# Altium footprint library PcbLib1.PcbLib: 1016 footprints (part 39 of 64)
Each footprint in its own frame and in the unit in brackets; x right, y up, seen from the top. Pads: shape width x height; smd on the part's side, far side on the other; paste and mask are expansions set on the pad; w line width, h text height; cw(c..) or ccw(c..) is an arc to the next point about the centre after c.
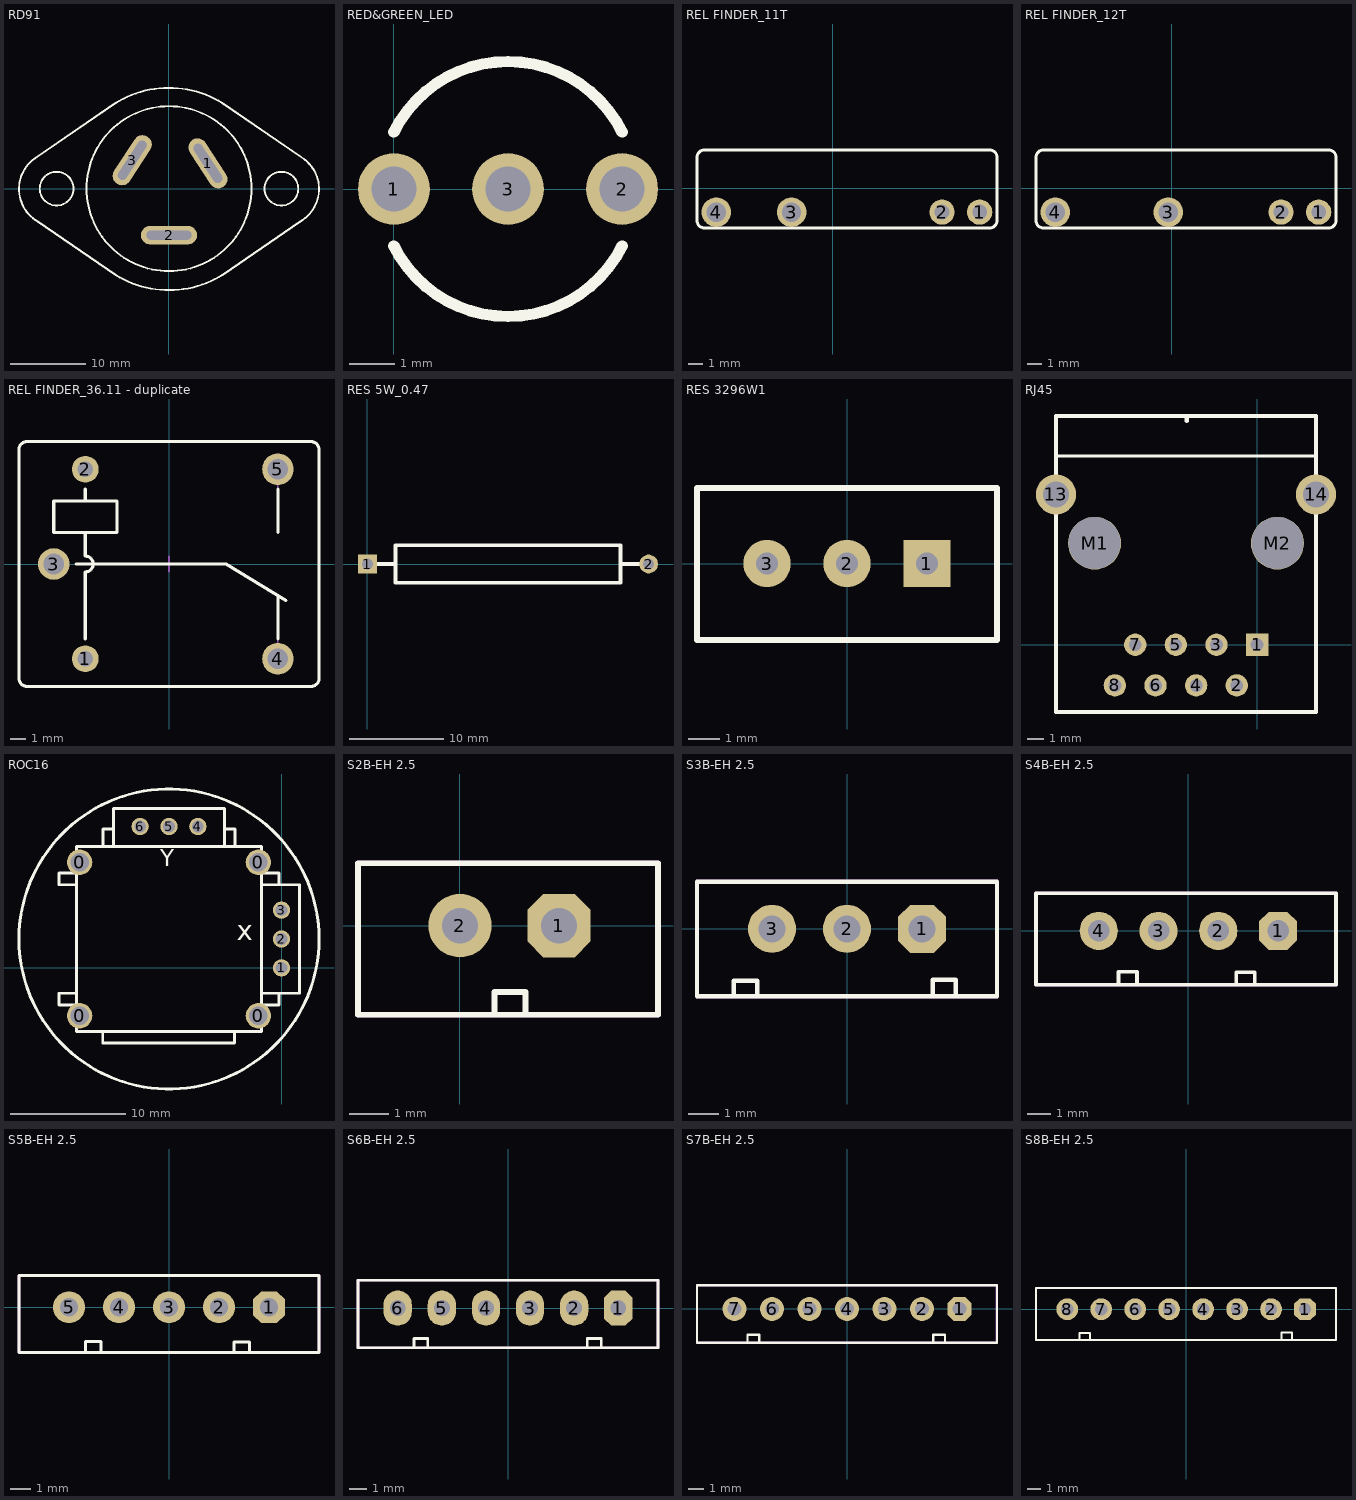
[diagram p38: the footprints below, top view; thin cyan lines are the x and y axes]

## RD91 [mm]
pads (3):
  oval 7.5x2.5 hole 1.2 slot 6 at 123 deg rot 123: 1(5.2,3.38)
  oval 7.5x2.5 hole 1.2 slot 6 at 0 deg: 2(0,-6.2)
  oval 7.5x2.5 hole 1.2 slot 6 at 57 deg rot 57: 3(-4.9,3.8)
Top Overlay:
  circle w0.254: c15,0 r2.25
  circle w0.254: c-15,0 r2.25
  circle w0.254: c0,0 r11
  lines w0.254: -17.599,4.245 ccw(c-15,-0.043) -17.502,-4.389 -7.123,-11.514 ccw(c0,-0.043) 7.234,-11.444 17.522,-4.378 ccw(c15,-0.043) 17.56,4.268 7.123,11.427 ccw(c0,-0.043) -7.234,11.357 -17.599,4.245

## RED&GREEN_LED [mm]
pads (3):
  round 1.6 hole 1 mask+0.051: 1(0,0) 2(5.08,0) 3(2.54,0)
Top Overlay:
  lines w0.254: 0,-1.27 ccw(c2.54,0) 5.08,-1.27 ; 0,1.27 cw(c2.54,0) 5.08,1.27

## REL FINDER_11T [mm] "8 Leads, Row Spacing 12 mm; Body 19mm x 15.5mm, 36 Serie"
height 15.5
pads (4):
  round 1.7 hole 1: 1(9.931,-1.626) 2(7.392,-1.626)
  round 2 hole 1.3: 3(-2.769,-1.626) 4(-7.849,-1.626)
Top Overlay:
  lines w0.2: -9.153,2.068 cw(c-8.653,2.068) -8.653,2.568 10.631,2.568 cw(c10.631,2.1) 11.1,2.1 11.1,-2.195 cw(c10.6,-2.195) 10.6,-2.695 -8.653,-2.695 cw(c-8.653,-2.195) -9.153,-2.195 -9.153,2.134
Mechanical 14:
  lines w0.1: 10.566,2.568 -8.645,2.568 ccw(c-8.645,2.068) -9.145,2.068 -9.145,-2.195 ccw(c-8.645,-2.195) -8.645,-2.695 10.6,-2.695 ccw(c10.6,-2.195) 11.1,-2.195 11.1,2.068 ccw(c10.6,2.068) 10.6,2.568

## REL FINDER_12T [mm] "8 Leads, Row Spacing 12 mm; Body 19mm x 15.5mm, 36 Serie"
height 15.5
pads (4):
  round 1.7 hole 1: 1(9.931,-1.626) 2(7.392,-1.626)
  round 2 hole 1.3: 3(-0.226,-1.626) 4(-7.849,-1.626)
Top Overlay:
  lines w0.2: -9.153,2.068 cw(c-8.653,2.068) -8.653,2.568 10.631,2.568 cw(c10.631,2.1) 11.1,2.1 11.1,-2.195 cw(c10.6,-2.195) 10.6,-2.695 -8.653,-2.695 cw(c-8.653,-2.195) -9.153,-2.195 -9.153,2.134
Mechanical 14:
  lines w0.1: 10.566,2.568 -8.645,2.568 ccw(c-8.645,2.068) -9.145,2.068 -9.145,-2.195 ccw(c-8.645,-2.195) -8.645,-2.695 10.6,-2.695 ccw(c10.6,-2.195) 11.1,-2.195 11.1,2.068 ccw(c10.6,2.068) 10.6,2.568
3D body "20737.stp": height 17.7, standoff -3.3, extent -9.195,-2.616 11.105,2.464

## REL FINDER_36.11 - duplicate [mm] "8 Leads, Row Spacing 12 mm; Body 19mm x 15.5mm, 36 Serie"
height 15.5
pads (5):
  round 1.7 hole 1: 1(-5.3,-6) 2(-5.3,6)
  round 2 hole 1.3: 3(-7.3,0) 4(6.9,-6) 5(6.9,6)
Top Overlay:
  lines w0.2: -5.9,0 3.6,0 7.4,-2.303 ; -5.3,-4.75 -5.3,-0.5 ccw(c-5.3,0) -5.3,0.5 -5.3,2 ; -5.3,4 -5.3,4.75 ; 6.9,-4.75 6.9,-2 ; 6.9,2 6.9,4.75 ; -9.5,-7.25 ccw(c-9,-7.25) -9,-7.75 9,-7.75 ccw(c9,-7.25) 9.5,-7.25 9.5,7.25 ccw(c9,7.25) 9,7.75 -9,7.75 ccw(c-9,7.25) -9.5,7.25 -9.5,-7.25 ; -7.3,2 -7.3,4 -3.3,4 -3.3,2 -7.3,2
Mechanical 8:
  lines w0.1: -7.8,0 -7.3,0 ; -7.3,-0.5 -7.3,0 ; -7.3,0.5 -7.3,0 ; -6.8,0 -7.3,0 ; -5.8,-6 -5.3,-6 ; -5.8,6 -5.3,6 ; -5.3,-6.5 -5.3,-6 ; -5.3,-5.5 -5.3,-6 ; -5.3,5.5 -5.3,6 ; -5.3,6.5 -5.3,6 ; -4.8,-6 -5.3,-6 ; -4.8,6 -5.3,6 ; -0.5,0 0,0 ; 0,-0.5 0,0 ; 0,0.5 0,0 ; 0.5,0 0,0 ; 6.4,-6 6.9,-6 ; 6.4,6 6.9,6 ; 6.9,-6.5 6.9,-6 ; 6.9,-5.5 6.9,-6 ; 6.9,5.5 6.9,6 ; 6.9,6.5 6.9,6 ; 7.4,-6 6.9,-6 ; 7.4,6 6.9,6
Mechanical 14:
  lines w0.1: -5.9,0 3.6,0 7.4,-2.303 ; -5.3,-4.75 -5.3,-0.5 ccw(c-5.3,0) -5.3,0.5 -5.3,2 ; -5.3,4 -5.3,4.75 ; 6.9,-6 6.9,-2 ; 6.9,2 6.9,6 ; -9.5,-7.25 ccw(c-9,-7.25) -9,-7.75 9,-7.75 ccw(c9,-7.25) 9.5,-7.25 9.5,7.25 ccw(c9,7.25) 9,7.75 -9,7.75 ccw(c-9,7.25) -9.5,7.25 -9.5,-7.25 ; -7.3,2 -7.3,4 -3.3,4 -3.3,2 -7.3,2
3D body "REL_FINDER_36.11.stp": height 15.5, standoff -3.6, extent -9.5,-7.75 9.5,7.75

## RES 5W_0.47 [mm]
pads (2):
  rect 2x2 hole 1.2 mask+0.051: 1(0,0)
  round 2 hole 1.2 mask+0.051: 2(30,0)
Top Overlay:
  lines w0.381: 1,0 3,0 ; 27,0 29,0 ; 3,0 3,-2 27,-2 27,2 3,2 3,0

## RES 3296W1 [mm] "Bourns,3296Y,25,±10% ,1/2W,±100ppm/°C"
pads (3):
  rect 1.5x1.5 hole 0.7: 1(2.54,0)
  round 1.5 hole 0.7 mask+0.07: 2(0,0) 3(-2.54,0)
Top Overlay:
  lines w0.2: -4.765,-2.431 4.765,-2.431 4.765,2.399 -4.765,2.399 -4.765,-2.431
3D body "0_7-0_7.stp": height 0, standoff -2.2, extent 1.94,-0.616 3.14,0.584
3D body "0_7-0_7.stp": height 0, standoff -2.2, extent -3.14,-0.616 -1.94,0.584
3D body "0_7-0_7.stp": height 0, standoff -2.2, extent -0.6,-0.616 0.6,0.584
3D body "vr6.stp": height 11.05, standoff -3, extent -4.775,-2.441 4.775,2.459

## RJ45 [mil] "RJ45无灯网口"
pads (12):
  rect 55x55 hole 31.5: 1(0,0)
  round 55 hole 31.5: 2(-50,-100) 3(-100,0) 4(-150,-100) 5(-200,0) 6(-250,-100) 7(-300,0) 8(-350,-100)
  round 98.42 hole 62.99: 13(-495,370) 14(145,370)
  round 130 hole 127.95 unplated: M1(-400,250) M2(50,250)
Top Overlay:
  lines w8: -488.19,464.57 141.73,464.57
  lines w10: -495,-165.35 144.65,-165.35 145,-165 145,370 145,562.99 -495,562.99 -495,370 -495,-165 ; -173.23,551.18 -173.23,559.06
3D body "Mod-Jack-K122449007-Stig-W.STEP": height 127.85, standoff -555.12, extent -490,-172.17 139.92,556.17

## ROC16 [mm]
pads (10):
  round 2.2 hole 1.6: 0(-17.5,-4.15) 0(-17.5,9.15) 0(-2,-4.15) 0(-2,9.15)
  round 1.5 hole 1: 1(0,0) 2(0,2.5) 3(0,5) 4(-7.25,12.25) 5(-9.75,12.25) 6(-12.25,12.25)
Top Overlay:
  circle w0.254: c-9.75,2.5 r13
  lines w0.254: -17.75,-3.215 -19.275,-3.215 -19.275,-2.199 -17.75,-2.199 ; -17.75,7.199 -19.275,7.199 -19.275,8.215 -17.75,8.215 ; -15.491,-5.528 -15.491,-6.517 -4.061,-6.517 -4.061,-5.527 -4.087,-5.553 ; -15.465,10.5 -15.465,12.025 -14.55,12.025 ; -14.55,10.5 -14.55,13.8 -4.95,13.8 -4.95,10.5 ; -4.95,11.644 -4.95,10.5 ; -4.95,12.025 -4.035,12.025 -4.035,10.5 ; -4.924,10.526 -4.95,10.5 ; -1.75,-3.215 -0.225,-3.215 -0.225,-2.199 ; -1.75,-2.199 -0.225,-2.199 ; -1.75,7.199 -0.225,7.199 ; -1.75,8.215 -0.225,8.215 -0.225,7.199 ; -0.225,-2.199 1.55,-2.199 1.551,0.075 ; -0.225,7.199 1.553,7.199 1.552,4.824 1.551,0.075 ; 1.551,0.075 1.551,0.075 ; -17.75,-5.5 -17.75,10.5 -1.75,10.5 -1.75,-5.5 -17.75,-5.5
  text "Y" at -10.512,8.342 h2.5
  text "x" at -3.883,1.763 h3
3D body "ROC16-.STEP": height 29.36, standoff -3.65, extent -22.25,-10.054 2.75,14.946

## S2B-EH 2.5 [mm]
height 3.25
pads (2):
  oct 1.6x1.6 hole 0.9: 1(2.5,0)
  round 1.6 hole 0.9 mask+0.07: 2(0,0)
Top Overlay:
  lines w0.15: 0.875,-2.175 0.875,-1.675 1.65,-1.675 1.65,-2.2 ; -2.575,-2.25 5,-2.25 5,1.575 -2.575,1.575 -2.575,-2.25
Mechanical 14:
  lines w0.15: -2.575,-2.25 5,-2.25 5,1.575 -2.575,1.575 -2.575,-2.25
Mechanical 15:
  lines w0.15: -2.575,-2.25 5,-2.25 5,1.575 -2.575,1.575 -2.575,-2.25
3D body "s2b-eh.stp": height 6, standoff -3.2, extent -2.575,-2.175 4.925,1.625

## S3B-EH 2.5 [mm]
height 3.25
pads (3):
  oct 1.6x1.6 hole 0.9: 1(2.5,0)
  round 1.6 hole 0.9 mask+0.07: 2(0,0) 3(-2.5,0)
Top Overlay:
  lines w0.15: -3.775,-2.225 -3.775,-1.725 -3,-1.725 -3,-2.25 ; 2.85,-2.2 2.85,-1.7 3.625,-1.7 3.625,-2.225 ; -5,-2.25 5,-2.25 5,1.575 -5,1.575 -5,-2.25
Mechanical 14:
  lines w0.15: -5,-2.25 5,-2.25 5,1.575 -5,1.575 -5,-2.25
Mechanical 15:
  lines w0.15: -5,-2.25 5,-2.25 5,1.575 -5,1.575 -5,-2.25
3D body "s3b-eh.stp": height 6, standoff -3.2, extent -5,-2.225 5,1.575

## S4B-EH 2.5 [mm]
height 3.25
pads (4):
  oct 1.6x1.6 hole 0.9: 1(3.75,0)
  round 1.6 hole 0.9 mask+0.07: 2(1.25,0) 3(-1.25,0) 4(-3.75,0)
Top Overlay:
  lines w0.15: -2.925,-2.2 -2.925,-1.7 -2.15,-1.7 -2.15,-2.225 ; 2,-2.225 2,-1.725 2.775,-1.725 2.775,-2.25 ; -6.375,-2.25 -6.375,1.575 6.175,1.575 6.175,-2.25 -6.375,-2.25
Mechanical 14:
  lines w0.15: -6.375,-2.25 -6.375,1.575 6.175,1.575 6.175,-2.25 -6.375,-2.25
Mechanical 15:
  lines w0.15: -6.375,-2.25 -6.375,1.575 6.175,1.575 6.175,-2.25 -6.375,-2.25
3D body "s4b-eh.stp": height 6, standoff -3.2, extent -6.375,-2.225 6.125,1.575

## S5B-EH 2.5 [mm]
height 3.25
pads (5):
  oct 1.6x1.6 hole 0.9: 1(5,0)
  round 1.6 hole 0.9 mask+0.07: 2(2.5,0) 3(0,0) 4(-2.5,0) 5(-5,0)
Top Overlay:
  lines w0.15: -4.175,-2.2 -4.175,-1.7 -3.4,-1.7 -3.4,-2.225 ; 3.25,-2.225 3.25,-1.725 4.025,-1.725 4.025,-2.25 ; -7.5,-2.25 7.5,-2.25 7.5,1.575 -7.5,1.575 -7.5,-2.25
Mechanical 14:
  lines w0.15: -7.5,-2.25 7.5,-2.25 7.5,1.575 -7.5,1.575 -7.5,-2.25
Mechanical 15:
  lines w0.15: -7.5,-2.25 7.5,-2.25 7.5,1.575 -7.5,1.575 -7.5,-2.25
3D body "s5b-eh.stp": height 6, standoff -3.2, extent -7.55,-2.25 7.45,1.55

## S6B-EH 2.5 [mm]
height 3.25
pads (6):
  oct 1.6x2 hole 0.9: 1(6.25,0)
  oval 1.6x2 hole 0.9 mask+0.07: 2(3.75,0) 3(1.25,0) 4(-1.25,0) 5(-3.75,0) 6(-6.25,0)
Top Overlay:
  lines w0.15: -5.325,-2.225 -5.325,-1.725 -4.55,-1.725 -4.55,-2.25 ; 4.5,-2.225 4.5,-1.725 5.275,-1.725 5.275,-2.25 ; -8.5,-2.25 -8.5,1.575 8.5,1.575 8.5,-2.25 -8.5,-2.25
Mechanical 14:
  lines w0.15: -8.5,-2.25 -8.5,1.575 8.5,1.575 8.5,-2.25 -8.5,-2.25
Mechanical 15:
  lines w0.15: -8.5,-2.25 -8.5,1.575 8.5,1.575 8.5,-2.25 -8.5,-2.25
3D body "s6b-eh.stp": height 6, standoff -3.2, extent -8.5,-2.2 8.5,1.6

## S7B-EH 2.5 [mm]
height 3.25
pads (7):
  oct 1.6x1.6 hole 0.9: 1(7.5,0)
  round 1.6 hole 0.9 mask+0.07: 2(5,0) 3(2.5,0) 4(0,0) 5(-2.5,0) 6(-5,0) 7(-7.5,0)
Top Overlay:
  lines w0.15: -6.625,-2.225 -6.625,-1.725 -5.85,-1.725 -5.85,-2.25 ; 5.75,-2.225 5.75,-1.725 6.525,-1.725 6.525,-2.25 ; -10,-2.25 10,-2.25 10,1.575 -10,1.575 -10,-2.25
Mechanical 14:
  lines w0.15: -10,-2.25 9.975,-2.25 9.975,1.575 -10,1.575 -10,-2.25
Mechanical 15:
  lines w0.15: -10,-2.25 10,-2.25 10,1.575 -10,1.575 -10,-2.25
3D body "s7b-eh.stp": height 6, standoff -3.2, extent -10,-2.225 10,1.575

## S8B-EH 2.5 [mm]
height 3.25
pads (8):
  oct 1.6x1.6 hole 0.9: 1(8.75,0)
  round 1.6 hole 0.9 mask+0.07: 2(6.25,0) 3(3.75,0) 4(1.25,0) 5(-1.25,0) 6(-3.75,0) 7(-6.25,0) 8(-8.75,0)
Top Overlay:
  lines w0.15: -7.85,-2.25 -7.85,-1.75 -7.075,-1.75 -7.075,-2.275 ; 7,-2.225 7,-1.725 7.775,-1.725 7.775,-2.25 ; -11.05,-2.25 -11.05,1.575 11.025,1.575 11.025,-2.25 -11.05,-2.25
Mechanical 14:
  lines w0.15: -11.05,-2.25 -11.05,1.575 11.025,1.575 11.025,-2.25 -11.05,-2.25
Mechanical 15:
  lines w0.15: -11.05,-2.25 -11.05,1.575 11.025,1.575 11.025,-2.25 -11.05,-2.25
3D body "s8b-eh.stp": height 6, standoff -3.2, extent -11,-2.175 11,1.625